# Altium footprint library Electronic Devices_LIB.PcbLib: 410 footprints (part 11 of 26)
Each footprint in its own frame and in the unit in brackets; x right, y up, seen from the top. Pads: shape width x height; smd on the part's side, far side on the other; paste and mask are expansions set on the pad; w line width, h text height; cw(c..) or ccw(c..) is an arc to the next point about the centre after c.
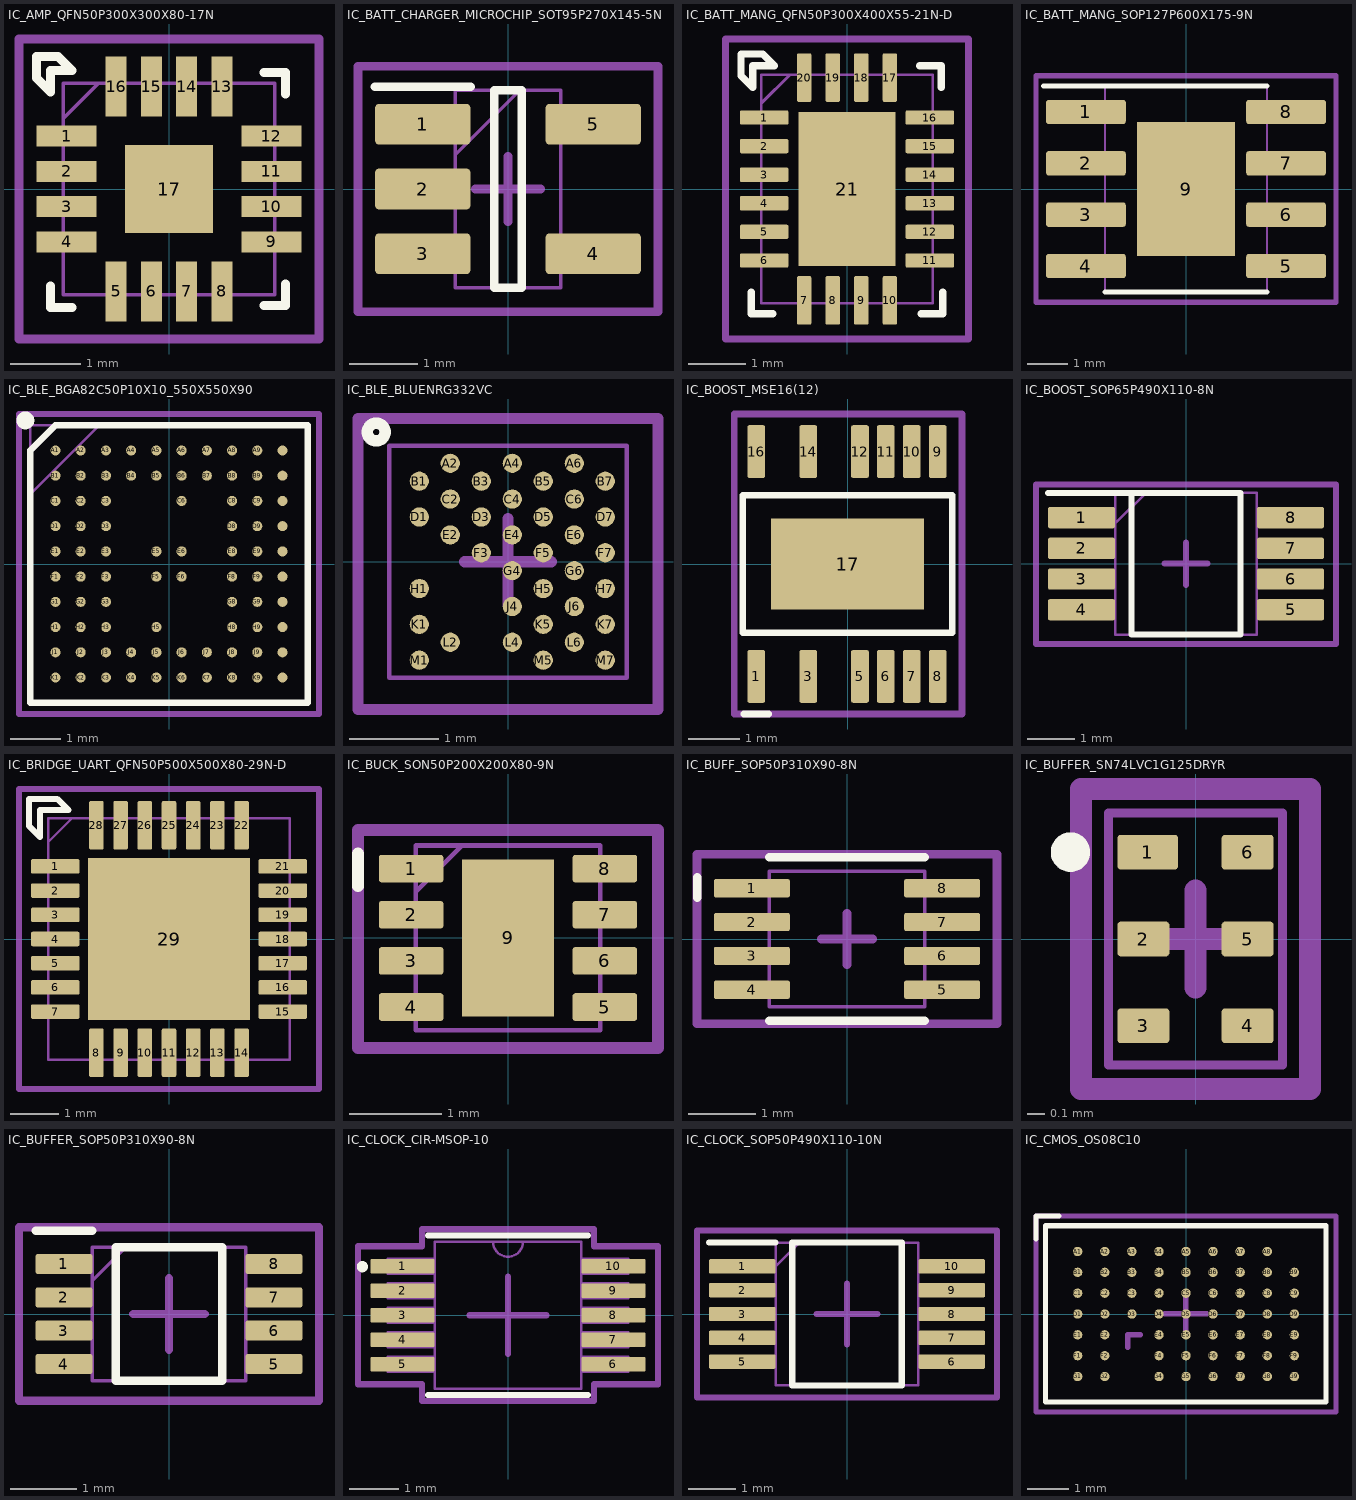
[diagram p10: the footprints below, top view; thin cyan lines are the x and y axes]

## IC_AMP_QFN50P300X300X80-17N [mm]
pads (17):
  rrect0% 0.85x0.3 smd: 1(-1.45,0.75) 2(-1.45,0.25) 3(-1.45,-0.25) 4(-1.45,-0.75) 9(1.45,-0.75) 10(1.45,-0.25) 11(1.45,0.25) 12(1.45,0.75)
  rrect0% 0.3x0.85 smd: 5(-0.75,-1.45) 6(-0.25,-1.45) 7(0.25,-1.45) 8(0.75,-1.45) 13(0.75,1.45) 14(0.25,1.45) 15(-0.25,1.45) 16(-0.75,1.45)
  rect 1.25x1.25 smd: 17(0,0)
Top Overlay:
  lines w0.127: -1.676,-1.372 -1.676,-1.676 -1.372,-1.676 ; 1.346,-1.651 1.651,-1.651 1.651,-1.346 ; 1.346,1.651 1.651,1.651 1.651,1.346 ; -1.88,1.575 -1.676,1.372 -1.676,1.676 -1.372,1.676 -1.575,1.88 -1.88,1.88 -1.88,1.575
Top Assembly:
  lines w0.051: -1.5,1 -1,1.5 ; -1.5,-1.5 1.5,-1.5 1.5,1.5 -1.5,1.5 -1.5,-1.5
  text ".Designator" at -2.591,-0.186 h0.51
Top Courtyard:
  lines w0.127: -0.457,0 0,0 ; 0,-0.457 0,0 ; 0,0.457 0,0 ; 0.457,0 0,0 ; -2.125,-2.125 -2.125,2.125 2.125,2.125 2.125,-2.125 -2.125,-2.125
3D body "MAX98357AETE+T.stp": height 0.8, standoff 0, extent -1.55,-1.55 1.55,1.55

## IC_BATT_CHARGER_MICROCHIP_SOT95P270X145-5N [mm] "SOT-23-5"
height 1.45
pads (5):
  rrect20% 1.4x0.6 smd: 1(-1.25,0.95) 2(-1.25,0) 3(-1.25,-0.95) 4(1.25,-0.95) 5(1.25,0.95)
Top Overlay:
  lines w0.127: -1.95,1.5 -0.55,1.5 ; -0.2,-1.45 -0.2,1.45 0.2,1.45 0.2,-1.45 -0.2,-1.45
Top Assembly:
  lines w0.051: -0.775,0.5 0.175,1.45 ; -0.775,-1.45 -0.775,1.45 0.775,1.45 0.775,-1.45 -0.775,-1.45
  text ".Designator" at -2.692,-0.059 h0.51
Top Courtyard:
  lines w0.127: -0.483,0 0,0 ; 0,-0.483 0,0 ; 0,0.483 0,0 ; 0.483,0 0,0 ; -2.2,-1.8 -2.2,1.8 2.2,1.8 2.2,-1.8 -2.2,-1.8
3D body "MCP73831T-2ACI_OT.stp": height 1.45, standoff 0, extent -1.35,-1.45 1.35,1.45

## IC_BATT_MANG_QFN50P300X400X55-21N-D [mm] "20-Lead UQFN"
height 0.55
pads (21):
  rrect20% 0.85x0.25 smd: 1(-1.45,1.25) 2(-1.45,0.75) 3(-1.45,0.25) 4(-1.45,-0.25) 5(-1.45,-0.75) 6(-1.45,-1.25) 11(1.45,-1.25) 12(1.45,-0.75) 13(1.45,-0.25) 14(1.45,0.25) 15(1.45,0.75) 16(1.45,1.25)
  rrect20% 0.25x0.85 smd: 7(-0.75,-1.95) 8(-0.25,-1.95) 9(0.25,-1.95) 10(0.75,-1.95) 17(0.75,1.95) 18(0.25,1.95) 19(-0.25,1.95) 20(-0.75,1.95)
  rect 1.7x2.7 smd: 21(0,0)
Top Overlay:
  lines w0.127: -1.676,-1.803 -1.676,-2.184 -1.295,-2.184 ; 1.27,2.159 1.651,2.159 1.651,1.778 ; 1.295,-2.184 1.676,-2.184 1.676,-1.803 ; -1.854,1.981 -1.651,1.778 -1.651,2.159 -1.27,2.159 -1.473,2.362 -1.854,2.362 -1.854,1.981
Top Assembly:
  lines w0.051: -1.5,1.5 -1,2 ; -1.5,-2 1.5,-2 1.5,2 -1.5,2 -1.5,-2
  text ".Designator" at -2.54,0.017 h0.51
Top Courtyard:
  lines w0.127: -0.457,-0.025 0,-0.025 ; 0,-0.483 0,-0.025 ; 0,0.432 0,-0.025 ; 0.457,-0.025 0,-0.025 ; -2.125,-2.625 -2.125,2.625 2.125,2.625 2.125,-2.625 -2.125,-2.625
3D body "PI3USB9281CXWEX.stp": height 0.55, standoff 0, extent -1.55,-2.05 1.55,2.05

## IC_BATT_MANG_SOP127P600X175-9N [mm] "SOP-8-EP"
height 1.75
pads (9):
  rrect20% 1.97x0.6 smd: 1(-2.475,1.905) 2(-2.475,0.635) 3(-2.475,-0.635) 4(-2.475,-1.905) 5(2.475,-1.905) 6(2.475,-0.635) 7(2.475,0.635) 8(2.475,1.905)
  rect 2.413x3.302 smd paste-3: 9(0,0)
Top Overlay:
  lines w0.127: -3.521,2.55 -2,2.55 2,2.55 ; -2,-2.55 2,-2.55
Top Paste:
  region: 0.645,-0.82 -0.645,-0.82 -0.645,0.82 0.645,0.82
Top Assembly:
  lines w0.051: -2,-2.55 -2,2.55 2,2.55 2,-2.55 -2,-2.55
  text ".Designator" at -2.642,-0.136 h0.51
Top Courtyard:
  lines w0.127: -3.71,-2.8 3.71,-2.8 3.71,2.8 -3.71,2.8 -3.71,-2.8
  lines w0.203: -0.533,0 0,0 ; 0,-0.533 0,0 ; 0,0.533 0,0 ; 0.533,0 0,0
3D body "step_temp.STEP": height 1.75, standoff 0, extent -3,-2.45 3,2.45

## IC_BLE_BGA82C50P10X10_550X550X90 [mm] "82-VFBGA, Pitch 0.5mm"
height 0.9
pads (82):
  round 0.2 smd: A1(-2.25,2.25) A2(-1.75,2.25) A3(-1.25,2.25) A4(-0.75,2.25) A5(-0.25,2.25) A6(0.25,2.25) A7(0.75,2.25) A8(1.25,2.25) A9(1.75,2.25) A10(2.25,2.25) B1(-2.25,1.75) B2(-1.75,1.75) B3(-1.25,1.75) B4(-0.75,1.75) B5(-0.25,1.75) B6(0.25,1.75) B7(0.75,1.75) B8(1.25,1.75) B9(1.75,1.75) B10(2.25,1.75) C1(-2.25,1.25) C2(-1.75,1.25) C3(-1.25,1.25) C6(0.25,1.25) C8(1.25,1.25) C9(1.75,1.25) C10(2.25,1.25) D1(-2.25,0.75) D2(-1.75,0.75) D3(-1.25,0.75) D8(1.25,0.75) D9(1.75,0.75) D10(2.25,0.75) E1(-2.25,0.25) E2(-1.75,0.25) E3(-1.25,0.25) E5(-0.25,0.25) E6(0.25,0.25) E8(1.25,0.25) E9(1.75,0.25) E10(2.25,0.25) F1(-2.25,-0.25) F2(-1.75,-0.25) F3(-1.25,-0.25) F5(-0.25,-0.25) F6(0.25,-0.25) F8(1.25,-0.25) F9(1.75,-0.25) F10(2.25,-0.25) G1(-2.25,-0.75) G2(-1.75,-0.75) G3(-1.25,-0.75) G8(1.25,-0.75) G9(1.75,-0.75) G10(2.25,-0.75) H1(-2.25,-1.25) H2(-1.75,-1.25) H3(-1.25,-1.25) H5(-0.25,-1.25) H8(1.25,-1.25) H9(1.75,-1.25) H10(2.25,-1.25) J1(-2.25,-1.75) J2(-1.75,-1.75) J3(-1.25,-1.75) J4(-0.75,-1.75) J5(-0.25,-1.75) J6(0.25,-1.75) J7(0.75,-1.75) J8(1.25,-1.75) J9(1.75,-1.75) J10(2.25,-1.75) K1(-2.25,-2.25) K2(-1.75,-2.25) K3(-1.25,-2.25) K4(-0.75,-2.25) K5(-0.25,-2.25) K6(0.25,-2.25) K7(0.75,-2.25) K8(1.25,-2.25) K9(1.75,-2.25) K10(2.25,-2.25)
Top Overlay:
  circle w0.2: c-2.845,2.845 r0.076
  lines w0.127: -2.75,-2.75 2.75,-2.75 2.75,2.75 -2.25,2.75 -2.75,2.25 -2.75,-2.75
Top Assembly:
  lines w0.051: -2.75,1.375 -1.375,2.75 ; -2.75,-2.75 2.75,-2.75 2.75,2.75 -2.75,2.75 -2.75,-2.75
  text ".Designator" at -2.438,-0.161 h0.51
Top Courtyard:
  lines w0.127: -2.972,-2.972 2.972,-2.972 2.972,2.972 -2.972,2.972 -2.972,-2.972
3D body "IS2083BM-232-TRAY.stp": height 0.9, standoff 0, extent -2.75,-2.75 2.75,2.75

## IC_BLE_BLUENRG332VC [mm] "36-WLCSP (2.65x 2.59)"
height 0.42
pads (36):
  round 0.215 smd mask+0.051: A2(-0.645,1.1) A4(0.048,1.1) A6(0.741,1.1) B1(-0.991,0.9) B3(-0.298,0.9) B5(0.394,0.9) B7(1.087,0.9) C2(-0.645,0.7) C4(0.048,0.7) C6(0.741,0.7) D1(-0.991,0.5) D3(-0.298,0.5) D5(0.394,0.5) D7(1.087,0.5) E2(-0.645,0.3) E4(0.048,0.3) E6(0.741,0.3) F3(-0.298,0.1) F5(0.394,0.1) F7(1.087,0.1) G4(0.048,-0.1) G6(0.741,-0.1) H1(-0.991,-0.3) H5(0.394,-0.3) H7(1.087,-0.3) J4(0.048,-0.5) J6(0.741,-0.5) K1(-0.991,-0.7) K5(0.394,-0.7) K7(1.087,-0.7) L2(-0.645,-0.9) L4(0.048,-0.9) L6(0.741,-0.9) M1(-0.991,-1.1) M5(0.394,-1.1) M7(1.087,-1.1)
Top Overlay:
  lines w0.127: -1.473,1.349 cw(c-1.473,1.449) -1.473,1.549 cw(c-1.473,1.449) -1.473,1.349
Top Assembly:
  lines w0.051: -1.326,-1.296 -1.326,1.296 1.326,1.296 1.326,-1.296 -1.326,-1.296
  text ".Designator" at -2.438,-0.288 h0.51
Top Courtyard:
  lines w0.127: -0.483,0 0,0 ; 0,-0.483 0,0 ; 0,0.483 0,0 ; 0.483,0 0,0 ; -1.676,-1.651 1.676,-1.651 1.676,1.6 -1.676,1.6 -1.676,-1.651
3D body "BLUENRG-332VC.stp": height 0.52, standoff 0, extent -1.326,-1.296 1.326,1.296

## IC_BOOST_MSE16(12) [mil] "16-MSOP-EP"
height 43.31
pads (13):
  rrect20% 13.5x40 smd: 1(-69.31,-85.45) 3(-29.94,-85.45) 5(9.43,-85.45) 6(29.11,-85.45) 7(48.8,-85.45) 8(68.48,-85.45) 9(68.48,85.45) 10(48.8,85.45) 11(29.11,85.45) 12(9.43,85.45) 14(-29.94,85.45) 16(-69.31,85.45)
  rect 116.02x69.02 smd: 17(0,0)
Top Overlay:
  lines w5: -79,-114 -60,-114 ; -79.51,-52.3 -79.51,52.15 79.51,52.15 79.51,-52.3 -79.51,-52.3
Top Assembly:
  lines w2: -79.51,-52.3 79.51,-52.3 79.51,52.15 -79.51,52.15 -79.51,-52.3
  text ".Designator" at -102,-4.34 h20
Top Courtyard:
  lines w5: -20,0 0,0 ; 0,-20 0,0 ; 0,20 0,0 ; 20,0 0,0 ; -86,-114 -86,114 87,114 87,-114 -86,-114
3D body "LT8331EMSE#PBF.stp": height 33.86, standoff -4, extent -79.51,-96.92 79.51,96.92

## IC_BOOST_SOP65P490X110-8N [mm] "8MSOP (0.118\", 3.00mm Width)"
height 1.1
pads (8):
  rrect20% 1.425x0.45 smd mask+0.076: 1(-2.212,0.975) 2(-2.212,0.325) 3(-2.212,-0.325) 4(-2.212,-0.975) 5(2.212,-0.975) 6(2.212,-0.325) 7(2.212,0.325) 8(2.212,0.975)
Top Overlay:
  lines w0.127: -2.925,1.5 -1.15,1.5 ; -1.15,1.5 -1.15,-1.5 1.15,-1.5 1.15,1.5 -1.15,1.5
Top Assembly:
  lines w0.051: -1.5,0.85 -0.85,1.5 ; -1.5,-1.5 -1.5,1.5 1.5,1.5 1.5,-1.5 -1.5,-1.5
  text ".Designator" at -2.624,-0.205 h0.51
Top Courtyard:
  lines w0.127: -0.45,0 0,0 ; 0,-0.45 0,0 ; 0,0.45 0,0 ; 0.45,0 0,0 ; -3.175,-1.7 -3.175,1.675 3.175,1.675 3.175,-1.7 -3.175,-1.7
3D body "PAM2401SCADJ.stp": height 1.1, standoff 0, extent -2.45,-1.5 2.45,1.5

## IC_BRIDGE_UART_QFN50P500X500X80-29N-D [mm]
pads (29):
  rrect20% 1x0.3 smd: 1(-2.35,1.5) 2(-2.35,1) 3(-2.35,0.5) 4(-2.35,0) 5(-2.35,-0.5) 6(-2.35,-1) 7(-2.35,-1.5) 15(2.35,-1.5) 16(2.35,-1) 17(2.35,-0.5) 18(2.35,0) 19(2.35,0.5) 20(2.35,1) 21(2.35,1.5)
  rrect20% 0.3x1 smd: 8(-1.5,-2.35) 9(-1,-2.35) 10(-0.5,-2.35) 11(0,-2.35) 12(0.5,-2.35) 13(1,-2.35) 14(1.5,-2.35) 22(1.5,2.35) 23(1,2.35) 24(0.5,2.35) 25(0,2.35) 26(-0.5,2.35) 27(-1,2.35) 28(-1.5,2.35)
  rect 3.35x3.35 smd: 29(0,0)
Top Overlay:
  lines w0.127: -2.896,2.337 -2.896,2.896 -2.311,2.896 -2.083,2.667 -2.667,2.667 -2.667,2.108 -2.896,2.337
Top Assembly:
  lines w0.051: -2.5,2 -2,2.5 ; -2.5,-2.5 2.5,-2.5 2.5,2.5 -2.5,2.5 -2.5,-2.5
  text ".Designator" at -2.515,-0.212 h0.51
Top Courtyard:
  lines w0.127: -0.61,0 0,0 ; 0,-0.61 0,0 ; 0,0.61 0,0 ; 0.61,0 0,0 ; -3.1,-3.1 3.1,-3.1 3.1,3.1 -3.1,3.1 -3.1,-3.1
3D body "CP2102N-A02-GQFN28R.stp": height 0.8, standoff 0, extent -2.55,-2.55 2.55,2.55

## IC_BUCK_SON50P200X200X80-9N [mm]
pads (9):
  rrect20% 0.7x0.3 smd: 1(-1.05,0.75) 2(-1.05,0.25) 3(-1.05,-0.25) 4(-1.05,-0.75) 5(1.05,-0.75) 6(1.05,-0.25) 7(1.05,0.25) 8(1.05,0.75)
  rect 1x1.7 smd: 9(0,0)
Top Overlay:
  lines w0.127: -1.626,0.559 -1.626,0.914
Top Assembly:
  lines w0.051: -1,0.5 -0.5,1 ; -1,-1 1,-1 1,1 -1,1 -1,-1
  text ".Designator" at -2.591,-0.136 h0.51
Top Courtyard:
  lines w0.127: -0.432,0 0,0 ; 0,-0.432 0,0 ; 0,0.432 0,0 ; 0.432,0 0,0 ; -1.625,-1.194 1.625,-1.194 1.625,1.168 -1.625,1.168 -1.625,-1.194
3D body "TPS62170DSGR.stp": height 0.77, standoff 0, extent -1,-1 1,1

## IC_BUFF_SOP50P310X90-8N [mm] "8-VFSOP (0.091\", 2.30mm Width)"
height 1.3
pads (8):
  rrect20% 1.12x0.27 smd: 1(-1.405,0.75) 2(-1.405,0.25) 3(-1.405,-0.25) 4(-1.405,-0.75) 5(1.405,-0.75) 6(1.405,-0.25) 7(1.405,0.25) 8(1.405,0.75)
Top Overlay:
  lines w0.127: -2.21,0.61 -2.21,0.914 ; -1.15,-1.205 1.15,-1.205 ; -1.15,1.205 1.15,1.205
Top Assembly:
  lines w0.051: -1.15,-1 -1.15,1 1.15,1 1.15,-1 -1.15,-1
  text ".Designator" at -2.667,-0.161 h0.51
Top Courtyard:
  lines w0.127: -0.381,0 0,0 ; 0,-0.381 0,0 ; 0,0.381 0,0 ; 0.381,0 0,0 ; -2.215,-1.25 -2.215,1.25 2.215,1.25 2.215,-1.25 -2.215,-1.25
3D body "SN74LVC2G125DCUT.STEP": height 0.9, standoff 0, extent -1.55,-1 1.55,1

## IC_BUFFER_SN74LVC1G125DRYR [mm]
pads (6):
  rrect20% 0.35x0.2 smd: 1(-0.275,0.5)
  rrect20% 0.3x0.2 smd: 2(-0.3,0) 3(-0.3,-0.5) 4(0.3,-0.5) 5(0.3,0) 6(0.3,0.5)
Top Overlay:
  lines w0.127: -0.77,0.5 cw(c-0.72,0.5) -0.67,0.5 cw(c-0.72,0.5) -0.77,0.5
Top Courtyard:
  lines w0.127: -0.279,0 0,0 ; 0,-0.279 0,0 ; 0,0.279 0,0 ; 0.279,0 0,0 ; -0.66,-0.864 -0.66,0.864 0.66,0.864 0.66,-0.864 -0.66,-0.864
Top 3D Body:
  lines w0.051: -0.5,-0.725 -0.5,0.725 0.5,0.725 0.5,-0.725 -0.5,-0.725
3D body "SN74LVC1G125DRYR.stp": height 0.7, standoff 0, extent -0.5,-0.725 0.5,0.725

## IC_BUFFER_SOP50P310X90-8N [mm]
pads (8):
  rrect20% 0.85x0.3 smd: 1(-1.575,0.75) 2(-1.575,0.25) 3(-1.575,-0.25) 4(-1.575,-0.75) 5(1.575,-0.75) 6(1.575,-0.25) 7(1.575,0.25) 8(1.575,0.75)
Top Overlay:
  lines w0.127: -2,1.25 -1.15,1.25 ; -0.8,-1 -0.8,1 0.8,1 0.8,-1 -0.8,-1
Top Assembly:
  lines w0.051: -1.15,0.5 -0.65,1 ; -1.15,-1 -1.15,1 1.15,1 1.15,-1 -1.15,-1
  text ".Designator" at -2.565,-0.085 h0.51
Top Courtyard:
  lines w0.127: -0.533,0 0,0 ; 0,-0.533 0,0 ; 0,0.533 0,0 ; 0.533,0 0,0 ; -2.25,-1.3 -2.25,1.3 2.25,1.3 2.25,-1.3 -2.25,-1.3
3D body "NC7NZ34K8X.stp": height 0.9, standoff 0, extent -1.55,-1 1.55,1

## IC_CLOCK_CIR-MSOP-10 [mil]
pads (10):
  rrect20% 51.5x12 smd: 1(-84.75,39.37) 2(-84.75,19.68) 3(-84.75,0) 4(-84.75,-19.68) 5(-84.75,-39.37) 6(84.75,-39.37) 7(84.75,-19.68) 8(84.75,0) 9(84.75,19.68) 10(84.75,39.37)
Top Overlay:
  circle w5: c-117,39 r2
  lines w5: -64,-64 64,-64 ; -64,64 64,64
Top Assembly:
  lines w2: -12,59 ccw(c0,59) 12,59 ; -96.5,-45.37 -96.5,-33.37 -59,-33.37 -59,-45.37 -96.5,-45.37 ; -96.5,-25.68 -96.5,-13.69 -59,-13.69 -59,-25.68 -96.5,-25.68 ; -96.5,-6 -96.5,6 -59,6 -59,-6 -96.5,-6 ; -96.5,13.69 -96.5,25.68 -59,25.68 -59,13.69 -96.5,13.69 ; -96.5,33.37 -96.5,45.37 -59,45.37 -59,33.37 -96.5,33.37 ; -59,-59 -59,59 59,59 59,-59 -59,-59 ; 59,-45.37 96.5,-45.37 96.5,-33.37 59,-33.37 59,-45.37 ; 59,-25.68 96.5,-25.68 96.5,-13.69 59,-13.69 59,-25.68 ; 59,-6 96.5,-6 96.5,6 59,6 59,-6 ; 59,13.69 96.5,13.69 96.5,25.68 59,25.68 59,13.69 ; 59,33.37 96.5,33.37 96.5,45.37 59,45.37 59,33.37
  text ".Designator" at -99,-6.34 h20
Top Courtyard:
  lines w5: -31,0 0,0 ; 0,-31 0,0 ; 0,31 0,0 ; 31,0 0,0 ; -120.5,-55.37 -69,-55.37 -69,-69 69,-69 69,-55.37 120.5,-55.37 120.5,55.37 69,55.37 69,69 -69,69 -69,55.37 -120.5,55.37 -120.5,-55.37
3D body "CIR-MSOP-10.step": height 43.11, standoff 0, extent -96.5,-59.02 96.5,59.02

## IC_CLOCK_SOP50P490X110-10N [mm]
pads (10):
  rrect20% 1.4x0.3 smd: 1(-2.2,1) 2(-2.2,0.5) 3(-2.2,0) 4(-2.2,-0.5) 5(-2.2,-1) 6(2.2,-1) 7(2.2,-0.5) 8(2.2,0) 9(2.2,0.5) 10(2.2,1)
Top Overlay:
  lines w0.127: -2.9,1.5 -1.5,1.5 ; -1.15,-1.5 -1.15,1.5 1.15,1.5 1.15,-1.5 -1.15,-1.5
Top Assembly:
  lines w0.051: -1.5,1 -1,1.5 ; -1.5,-1.5 -1.5,1.5 1.5,1.5 1.5,-1.5 -1.5,-1.5
  text ".Designator" at -2.591,-0.161 h0.51
Top Courtyard:
  lines w0.127: -0.635,0 0,0 ; 0,-0.635 0,0 ; 0,0.635 0,0 ; 0.635,0 0,0 ; -3.15,-1.75 -3.15,1.75 3.15,1.75 3.15,-1.75 -3.15,-1.75
3D body "SI5351A-B-GT.stp": height 1.1, standoff 0, extent -2.45,-1.5 2.45,1.5

## IC_CMOS_OS08C10 [mm]
pads (59):
  round 0.225 smd paste+0 mask+0.076: A1(-2.6,1.5) A2(-1.95,1.5) A3(-1.3,1.5) A4(-0.65,1.5) A5(0,1.5) A6(0.65,1.5) A7(1.3,1.5) A8(1.95,1.5) B1(-2.6,1) B2(-1.95,1) B3(-1.3,1) B4(-0.65,1) B5(0,1) B6(0.65,1) B7(1.3,1) B8(1.95,1) B9(2.6,1) C1(-2.6,0.5) C2(-1.95,0.5) C3(-1.3,0.5) C4(-0.65,0.5) C5(0,0.5) C6(0.65,0.5) C7(1.3,0.5) C8(1.95,0.5) C9(2.6,0.5) D1(-2.6,0) D2(-1.95,0) D3(-1.3,0) D4(-0.65,0) D5(0,0) D6(0.65,0) D7(1.3,0) D8(1.95,0) D9(2.6,0) E1(-2.6,-0.5) E2(-1.95,-0.5) E4(-0.65,-0.5) E5(0,-0.5) E6(0.65,-0.5) E7(1.3,-0.5) E8(1.95,-0.5) E9(2.6,-0.5) F1(-2.6,-1) F2(-1.95,-1) F4(-0.65,-1) F5(0,-1) F6(0.65,-1) F7(1.3,-1) F8(1.95,-1) F9(2.6,-1) G1(-2.6,-1.5) G2(-1.95,-1.5) G4(-0.65,-1.5) G5(0,-1.5) G6(0.65,-1.5) G7(1.3,-1.5) G8(1.95,-1.5) G9(2.6,-1.5)
Top Overlay:
  lines w0.127: -3.6,1.8 -3.6,2.35 -3.05,2.35 ; 3.36,2.119 3.36,-2.11 -3.37,-2.11 -3.37,-2.11 -3.37,2.12 3.36,2.12
Mechanical 1:
  lines w0.127: -1.4,-0.8 -1.4,-0.5 -1.1,-0.5
Top Courtyard:
  lines w0.127: -3.6,-2.35 -2.55,-2.35 3.6,-2.35 ; -3.6,-2.3 -3.6,2.35 3.6,2.35 3.6,-2.3 ; -0.513,0.005 -0.005,0.005 ; -0.005,-0.503 -0.005,0.005 ; -0.005,0.513 -0.005,0.005 ; 0.503,0.005 -0.005,0.005